# Altium schematic symbol library BARKO_SCHLIB.SchLib: 1064 symbols (part 2 of 11) (continued)
## CON-4POS-2MM (continued)
CONN HEADER VERT 4POS 2MM; Manufacturer: TE Connectivity; Manufacturer Part Number: 1735446-4; Number of Positions: 4; Connector Type: Header,Pin,Plug; Mating Retention: Yes (With); Sealable: No (Without); Contact Current Rating: 3A; Wire/Cable Type: Discrete; Connector System: Wire-to-Board; Plating Thickness: 2.03um; Pitch: 0.079inch; Wire/Cable Gauge: 30AWG; PCB Thickness: 1.6mm; Tail Length: 3.4mm; Contact Post Length: 0.134inch; .Creator: F:TALI; .PCBCHK: USED; Washability: OK; Supplier 1: Digi-Key; Stock 1: 66082; Pricing 1: 1=0.14, 10=0.131, 100=0.0808, 500=0.06688, 1000=0.05851, 5000=0.05016, 10000=0.04876 (USD); Mount: Through Hole; Color: Natural; Contact Material: Copper Alloy; Housing Color: Natural; Housing Material: Thermoplastic; Contact Plating: Bright,Tin; Contact Shape: Square; Min Operating Temperature: -13°C; Max Operating Temperature: 185°C; Number of Rows: 1; Package Quantity: 500; Packaging: Bag; Contact Gender: Male; Termination: Through Hole; Number of Contacts: 4; Orientation: Straight; Strain Relief: No (Without); Backwall/Post Interruptions: No (Without); Contact Retention: No (Without); PCB Mount Alignment: No (Without); Selectively Loaded: No (Without); Length: 10mm; Height: 0.239inch; Width: 0.185inch; Contact Mating Length: 0.132inch; Radiation Hardening: No; Flammability Rating: UL94 V-0; REACH SVHC: Unknown; ComponentLink1URL: http://www.onlinecomponents.com/productFiles/mf-AMP/pgurl_1735446-4.pdf?src-supplier=Onlinecomponents.com; ComponentLink1Description: http://www.onlinecomponents.com/productFiles/mf-AMP/pgurl_1735446-4.pdf?src-supplier=Onlinecomponents.com; ComponentLink2URL: https://www.te.com/commerce/DocumentDelivery/DDEController?Action=srchrtrv&DocNm=1735446&DocType=Customer+Drawing&DocLang=English&src-supplier=Digi-Key; ComponentLink2Description: https://www.te.com/commerce/DocumentDelivery/DDEController?Action=srchrtrv&DocNm=1735446&DocType=Customer+Drawing&DocLang=English&src-supplier=Digi-Key; Supplier Part Number 1: A100098-ND; .SCHCHK: USED
footprint CON-4POS-2MM-VERT
pins: 1 GND_IN, 2, 3, 4

## CON-4POS-2MM-PH-SM4-TB(LF)(SN)
designator J?, comment 2MM
CONN HEADER SMD R/A 4POS 2MM; Manufacturer 1: JST; Manufacturer Part Number 1: S4B-PH-SM4-TB(LF)(SN); Current Rating: 2A; Voltage Rating: 100V; Number of Positions: 4; Insulation Resistance: 1GR; Gender: Male; Contact Resistance: 20mR; Washability: OK; .Creator: M.OZKAN; .PCBCHK: USED; Supplier 1: Arrow; Stock 1: 109400; Pricing 1: 1000=0,26000, 2000=0,25260, 3000=0,24080, 5000=0,23360, 10000=0,22180, 25000=0,19960 (USD); RoHS: Yes; Mount: Surface Mount; Color: Natural; Contact Material: Copper Alloy; Contact Plating: Tin; Housing Color: Beige; Housing Material: Polyamide; Contact Shape: Square; Insulation Material: Nylon; Insulation Color: Natural; Min Operating Temperature: -25°C; Max Operating Temperature: 85°C; Number of Rows: 1; Packaging: Tape and Reel; Voltage Rating (AC): 100V; Termination: Solder; Number of Contacts: 4; Orientation: Right Angle; Number of Poles: 4; Max Current Rating: 2A; Fastening Type: Detent; Working Voltage: 100V; Max Voltage Rating (AC): 100V; Max Voltage Rating (DC): 100V; Connector Type: Header; Length: 11.9mm; Height: 9.4mm; Width: 5mm; Pitch: 2mm; Lead Pitch: 2mm; Contact Mating Length: 0.13inch; Depth: 7.6mm; Lead Free: Lead Free; REACH SVHC: No SVHC; Flammability Rating: UL94 V-0; ComponentLink1URL: https://datasheet.ciiva.com/11746/0900766b80df0d9d-11746552.pdf?src-supplier=RSComponents; ComponentLink1Description: https://datasheet.ciiva.com/11746/0900766b80df0d9d-11746552.pdf?src-supplier=RSComponents; ComponentLink2URL: https://datasheet.ciiva.com/712/eph-712578.pdf?src-supplier=Digi-Key; ComponentLink2Description: https://datasheet.ciiva.com/712/eph-712578.pdf?src-supplier=Digi-Key; ComponentLink3URL: https://datasheet.ciiva.com/712/eph-712579.pdf?src-supplier=Digi-Key; ComponentLink3Description: https://datasheet.ciiva.com/712/eph-712579.pdf?src-supplier=Digi-Key; ComponentLink4URL: https://datasheet.ciiva.com/730/eph-730675.pdf?src-supplier=Digi-Key; ComponentLink4Description: https://datasheet.ciiva.com/730/eph-730675.pdf?src-supplier=Digi-Key; ComponentLink5URL: https://datasheet.ciiva.com/8052/1699381-8052234.pdf?src-supplier=Element14; ComponentLink5Description: https://datasheet.ciiva.com/8052/1699381-8052234.pdf?src-supplier=Element14; ComponentLink6URL: https://datasheet.ciiva.com/26894/getdatasheetpartid-639990-26894620.pdf?src-supplier=Verical; ComponentLink6Description: https://datasheet.ciiva.com/26894/getdatasheetpartid-639990-26894620.pdf?src-supplier=Verical; ComponentLink7URL: https://datasheet.ciiva.com/16376/eph-16376783.pdf?src-supplier=Future+Electronics; ComponentLink7Description: https://datasheet.ciiva.com/16376/eph-16376783.pdf?src-supplier=Future+Electronics; Supplier Part Number 1: S4B-PH-SM4-TB (LF)(SN); .SCHCHK: USED
footprint CON-4POS-2MM-R/A (CONN HEADER SMD R/A 4POS 2MM)
pins: 1 GND_IN, 2, 3, 4, MP1 GND_IN, MP2 GND_IN

## CON-4POS-2MM-RA
designator J?, comment 2MM
CONN HEADER R/A 4POS 2MM; Manufacturer: JST; Manufacturer Part Number: S4B-PH-K-S(LF)(SN); Voltage Rating: 100V; Number of Poles: 4; Contact Resistance: 10mR; Current Rating: 2A; Insulation Resistance: 1GR; Gender: Male; Connector Type: Male Pin; .Creator: F:TALI; .PCBCHK: USED; Washability: OK; Supplier 1: Digi-Key; Supplier Part Number 1: 455-1721-ND; Stock 1: 350055; Pricing 1: 1=0.22, 10=0.208, 100=0.144, 500=0.12186, 1000=0.0997, 5000=0.08862, 10000=0.08031 (USD); Mount: Through Hole; Number of Pins: 4; Contact Material: Brass,Bronze,Tin; Contact Plating: Tin; Color: Natural,White; Housing Color: Natural; Min Operating Temperature: -25°C; Max Operating Temperature: 85°C; Packaging: Bulk; Termination: Solder; Number of Rows: 1; Voltage Rating (AC): 100V; Number of Positions: 4; Fastening Type: Detent; Number of Contacts: 4; Working Voltage: 100V; Orientation: Right Angle; Length: 9.9mm; Height: 9.4mm; Width: 4.5mm; Lead Pitch: 2mm; Pitch: 2mm; Contact Mating Length: 0.13inch; Lead Free: Lead Free; REACH SVHC: No SVHC; Flammability Rating: UL94 V-0; ComponentLink1URL: http://www.jst-mfg.com/product/pdf/eng/ePH.pdf?src-supplier=Digi-Key; ComponentLink1Description: http://www.jst-mfg.com/product/pdf/eng/ePH.pdf?src-supplier=Digi-Key; .SCHCHK: USED
footprint CON-4POS-2MM-RA
pins: 1 GND_IN, 2, 3, 4

## CON-4POS-2MM-SMD
designator J?, comment 2MM
CONN HEADER SMD 4POS 2MM; Manufacturer: JST; Manufacturer Part Number: B4B-PH-SM4-TB(LF)(SN); Number of Positions: 4; Connector Type: Male Pin; Contact Resistance: 20mR; Current Rating: 2A; Voltage Rating (AC): 100V; Insulation Resistance: 1GR; Gender: Male; .Creator: F:TALI; .PCBCHK: USED; Washability: OK; Supplier 1: Digi-Key; Supplier Part Number 1: 455-1736-6-ND; Stock 1: 141980; Pricing 1: 1=0.8, 10=0.75, 100=0.5751, 500=0.50006 (USD); Mount: Surface Mount; Contact Plating: Copper,Tin; Color: Natural,White; Contact Material: Brass,Bronze,Copper Alloy,Tin; Housing Color: Beige; Housing Material: Polyamide; Min Operating Temperature: -25°C; Max Operating Temperature: 85°C; Number of Rows: 1; Packaging: Tape and Reel; Voltage Rating: 100V; Max Current Rating: 2A; Number of Poles: 4; Termination: Solder; Fastening Type: Detent; Number of Contacts: 4; Max Voltage Rating (AC): 100V; Working Voltage: 100V; Orientation: Straight; Length: 11.95mm; Height: 9.4mm; Pitch: 2mm; Lead Pitch: 2mm; Width: 5.5mm; Contact Mating Length: 0.13inch; Depth: 5mm; Lead Free: Lead Free; REACH SVHC: No SVHC; Flammability Rating: UL94 V-0; ComponentLink1URL: http://www.farnell.com/datasheets/1699381.pdf?src-supplier=Element14; ComponentLink1Description: http://www.farnell.com/datasheets/1699381.pdf?src-supplier=Element14; ComponentLink2URL: http://uk.rs-online.com/webdocs/13ce/0900766b813ce4ba.pdf?src-supplier=RSComponents; ComponentLink2Description: http://uk.rs-online.com/webdocs/13ce/0900766b813ce4ba.pdf?src-supplier=RSComponents; ComponentLink3URL: http://www.farnell.com/datasheets/1699381.pdf?src-supplier=Newark; ComponentLink3Description: http://www.farnell.com/datasheets/1699381.pdf?src-supplier=Newark; ComponentLink4URL: http://www.jst-mfg.com/product/pdf/eng/ePH.pdf?src-supplier=Digi-Key; ComponentLink4Description: http://www.jst-mfg.com/product/pdf/eng/ePH.pdf?src-supplier=Digi-Key; .SCHCHK: USED
pins: 1 GND_IN, 2, 3, 4, MP1, MP2

## CON-4POS-2MM-SOW3
designator J?, comment Supplier Part Number 1: 455-1706-ND  (hidden comment: B4B-PH-K-S(LF)(SN))
CONN HEADER VERT 4POS 2MM; Manufacturer: JST; Voltage Rating: 100V; Current Rating: 2A; Contact Resistance: 20mR; Number of Poles: 4; Insulation Resistance: 1MR; Gender: Male; Connector Type: Male Pin; Washability: OK; .Creator: M.OZKAN; .PCBCHK: USED; Supplier 1: Digi-Key; Manufacturer Part Number: B4B-PH-K-S(LF)(SN); Stock 1: 16457; Pricing 1: 1=0.240000, 10=0.227000, 100=0.157300, 500=0.133120, 1000=0.108920, 5000=0.096820, 10000=0.087740 (USD); RoHS: Yes; Mount: Through Hole; Number of Pins: 4; Contact Material: Brass,Tin; Contact Plating: Tin,Copper; Color: Natural; Housing Color: White; Housing Material: Polyamide; Material: Polyamide; Min Operating Temperature: -25°C; Max Operating Temperature: 85°C; Packaging: Bulk; Termination: Solder; Number of Rows: 1; Max Current Rating: 2A; Voltage Rating (AC): 100V; Number of Positions: 4; Fastening Type: Detent; Number of Contacts: 4; Max Voltage Rating (AC): 100V; Max Voltage Rating (DC): 100V; Working Voltage: 100V; Orientation: Straight; Length: 9.9mm; Height: 9.4mm; Width: 4.5mm; Depth: 4.5mm; Lead Pitch: 2mm; Pitch: 2mm; Contact Mating Length: 0.13inch; Lead Free: Lead Free; REACH SVHC: No SVHC; ComponentLink1URL: https://datasheet.ciiva.com/11747/0900766b8082f552-11747200.pdf?src-supplier=RSComponents; ComponentLink1Description: https://datasheet.ciiva.com/11747/0900766b8082f552-11747200.pdf?src-supplier=RSComponents; ComponentLink2URL: https://datasheet.ciiva.com/712/eph-712488.pdf?src-supplier=Digi-Key; ComponentLink2Description: https://datasheet.ciiva.com/712/eph-712488.pdf?src-supplier=Digi-Key; ComponentLink3URL: https://datasheet.ciiva.com/16209/eph-16209245.pdf?src-supplier=Future+Electronics; ComponentLink3Description: https://datasheet.ciiva.com/16209/eph-16209245.pdf?src-supplier=Future+Electronics; ComponentLink4URL: https://datasheet.ciiva.com/43491/741223-da-01-en-stiftleiste-gerade-4-pol-rm2-0-43491964.pdf?src-supplier=Conrad; ComponentLink4Description: https://datasheet.ciiva.com/43491/741223-da-01-en-stiftleiste-gerade-4-pol-rm2-0-43491964.pdf?src-supplier=Conrad; .SCHCHK: USED
footprint JST-B4B-PH-K-S_V (Connector, 4-Leads, Body 9.9x4.5mm, Pitch 2mm)
pins: 1, 2, 3, 4

## CON-4POS-3MM-RA
designator J?  Mount: TH  Orientation: RA  Lead Pitch: 3mm  (hidden comment: *)
CONN HEADER 4POS 3MM RT ANG TIN; Manufacturer: Molex; Manufacturer Part Number: 43045-0400; Number of Positions: 4; Current Rating: 5A; Voltage Rating (AC): 250V; Contact Resistance: 10mR; Gender: Male; Voltage Rating: 600V; Max Voltage Rating (DC): 250.25kV; Glow Wire Compliant: Compliant; Approvals: CSA,TUV,UL; .PCBCHK: USED; .Creator: F:TALI; Washability: OK; Supplier 1: Digi-Key; Stock 1: 22999; Pricing 1: 1=1.42, 10=1.289, 100=1.1052, 500=0.92102, 2232=0.76314, 6696=0.69998, 11160=0.68419 (USD); Case/Package: SMC; Contact Material: Brass,Tin; Contact Plating: Tin; Colour: Black; Housing Colour: Black; Material: Polyester; Housing Material: Thermoplastic; Min Operating Temperature: -40°C; Max Operating Temperature: 105°C; Number of Rows: 2; Number of Contacts: 4; Packaging: Tray; Termination: Solder; Number of Circuits: 4; Package Quantity: 2232; Number of Poles: 4; Contact Gender: Male; Working Voltage: 250V; Diameter: 3mm; Pitch: 3mm; Row Spacing: 3mm; Radiation Hardening: No; Flammability Rating: UL94 V-0; Halogen Free: Low Halogen; Lead Free: Lead Free; REACH SVHC: Unknown; ComponentLink1URL: http://www.mouser.com/ds/2/276/0430450400_PCB_HEADERS-168191.pdf; ComponentLink1Description: http://www.mouser.com/ds/2/276/0430450400_PCB_HEADERS-168191.pdf; ComponentLink2URL: http://www.molex.com/webdocs/datasheets/pdf/en-us/0430450400_PCB_HEADERS.pdf; ComponentLink2Description: http://www.molex.com/webdocs/datasheets/pdf/en-us/0430450400_PCB_HEADERS.pdf; ComponentLink3URL: http://www.rapidonline.com/pdf/22-3744e.pdf; ComponentLink3Description: http://www.rapidonline.com/pdf/22-3744e.pdf; ComponentLink4URL: http://www.farnell.com/datasheets/2153088.pdf; ComponentLink4Description: http://www.farnell.com/datasheets/2153088.pdf; ComponentLink5URL: http://uk.rs-online.com/webdocs/13c3/0900766b813c3a47.pdf; ComponentLink5Description: http://uk.rs-online.com/webdocs/13c3/0900766b813c3a47.pdf; ComponentLink6URL: https://www.alliedelec.com/m/d/e1d2fe0a53791775edaf6c29add04568.pdf; ComponentLink6Description: https://www.alliedelec.com/m/d/e1d2fe0a53791775edaf6c29add04568.pdf; Supplier Part Number 1: WM1814-ND; .SCHCHK: USED
pins: 1 GND_IN, 2, 3, 4

## CON-4POS-3MM-VERT
designator J?  Orientation: VRT  Row Spacing: 3mm  Mount: TH  (hidden comment: *)
CONN HEADER 4POS 3MM VERT TIN; Manufacturer: Molex; Manufacturer Part Number: 43045-0412; Number of Positions: 4; Contact Resistance: 10mR; Max Voltage Rating (DC): 250.25kV; Current Rating: 5A; Gender: Male; Connector Type: Plug,Socket; Operating Supply Voltage: 250V; Glow Wire Compliant: Compliant; Approvals: CSA,TUV,UL; .PCBCHK: USED; .Creator: F:TALI; Washability: OK; Supplier 1: Digi-Key; Stock 1: 15048; Pricing 1: 1=1.26, 10=1.11, 100=0.9579, 500=0.78372, 2232=0.6531, 6696=0.60956, 11160=0.57908 (USD); Contact Material: Brass,Tin; Contact Plating: Tin; Colour: Black; Housing Colour: Black; Material: Polyester; Housing Material: Thermoplastic; Min Operating Temperature: -40°C; Max Operating Temperature: 105°C; Number of Rows: 2; Number of Contacts: 4; Packaging: Tray; Termination: Solder; Number of Circuits: 4; Voltage Rating: 250V; Max Current Rating: 5A; Package Quantity: 2232; Diameter: 3mm; Length: 10.15mm; Height: 9.91mm; Pitch: 3mm; Depth: 8.77mm; Radiation Hardening: No; Flammability Rating: UL94 V-0; Halogen Free: Low Halogen; Lead Free: Lead Free; REACH SVHC: Unknown; ComponentLink1URL: http://uk.rs-online.com/webdocs/13c3/0900766b813c3a54.pdf; ComponentLink1Description: http://uk.rs-online.com/webdocs/13c3/0900766b813c3a54.pdf; ComponentLink2URL: http://www.molex.com/webdocs/datasheets/pdf/en-us/0430450412_PCB_HEADERS.pdf; ComponentLink2Description: http://www.molex.com/webdocs/datasheets/pdf/en-us/0430450412_PCB_HEADERS.pdf; ComponentLink3URL: http://www.rapidonline.com/pdf/22-3730e.pdf; ComponentLink3Description: http://www.rapidonline.com/pdf/22-3730e.pdf; ComponentLink4URL: http://www.jameco.com/Jameco/Products/ProdDS/883368.pdf; ComponentLink4Description: http://www.jameco.com/Jameco/Products/ProdDS/883368.pdf; ComponentLink5URL: http://www.farnell.com/datasheets/1928349.pdf; ComponentLink5Description: http://www.farnell.com/datasheets/1928349.pdf; Supplier Part Number 1: WM1790-ND; .SCHCHK: USED
pins: 1 GND_IN, 2, 3, 4

## CON-4POS-IOLINK
designator J?, comment 3.54MM
CONN PLUG FMALE 4POS GOLD SOLDER; Manufacturer: TE Connectivity; Manufacturer Part Number: T4145515041-001; Plating: Nickel; Connector Type: Receptacle,Socket; Connector System: Wire-to-Board; Mating Retention: Yes (With); Number of Positions: 4; Shielding: Unshielded; Supplier 1: Digi-Key; Supplier Part Number 1: A126539-ND; Stock: 398; Pricing: 1=7.15, 10=6.854, 25=6.258, 50=5.96, 100=5.662, 250=5.066, 500=4.768, 1000=4.172, 2500=3.9634 (USD); RoHS: No; Mount: Panel; Insulation Material: Polyamide; Shell Material: Brass; Min Operating Temperature: -40°C; Max Operating Temperature: 85°C; Number of Signal Positions: 4; Sealable: Yes (With)
footprint CON-4PIN-IOLINK
pins: 1 GND_IN, 2, 3, 4, MH1, MH2, MH3, MH4

## CON-5POS-1MM-SMD
designator J?, comment 1MM  Mating: 5013300500
CONN HEADER SMD 5POS 1MM; Manufacturer: Molex; Manufacturer Part Number: 501331-0507; Voltage Rating: 50V; Contact Resistance: 20mR; Max Voltage Rating (DC): 5.05kV; Current Rating: 1A; Number of Positions: 5; Gender: Male; Connector Type: Male Pin; Glow Wire Compliant: Non-compliant; Washability: OK; .Creator: M.OZKAN; .PCBCHK: USED; Supplier 1: Digi-Key; Supplier Part Number 1: WM7882CT-ND; Stock 1: 29165; Pricing 1: 1=0.66000, 10=0.62200, 100=0.47670, 500=0.41448 (USD); RoHS: Yes; Mount: Surface Mount; Color: Natural; Contact Plating: Tin; Contact Material: Bronze,Tin; Housing Color: Natural; Housing Material: Nylon; Min Operating Temperature: -40°C; Max Operating Temperature: 85°C; Package Quantity: 1100; Packaging: Tape and Reel; Number of Rows: 1; Voltage Rating (AC): 50V; Termination: Solder; Fastening Type: Detent; Number of Contacts: 5; Max Voltage Rating (AC): 50V; Contact Gender: Male; Orientation: Vertical; Number of Circuits: 5; Length: 7.24mm; Pitch: 1mm; Depth: 3.6mm; Radiation Hardening: No; REACH SVHC: Unknown; Lead Free: Lead Free; ComponentLink1URL: https://datasheet.ciiva.com/11748/0900766b80b0af91-11748006.pdf?src-supplier=RSComponents; ComponentLink1Description: https://datasheet.ciiva.com/11748/0900766b80b0af91-11748006.pdf?src-supplier=RSComponents; ComponentLink2URL: https://datasheet.ciiva.com/30169/101445013310507-pcb-headers-30169975.pdf?src-supplier=Onlinecomponents.com; ComponentLink2Description: https://datasheet.ciiva.com/30169/101445013310507-pcb-headers-30169975.pdf?src-supplier=Onlinecomponents.com; ComponentLink3URL: https://datasheet.ciiva.com/9469/5013310507-pcb-headers-9469065.pdf?src-supplier=Avnet; ComponentLink3Description: https://datasheet.ciiva.com/9469/5013310507-pcb-headers-9469065.pdf?src-supplier=Avnet; ComponentLink4URL: https://datasheet.ciiva.com/5156/5013310507-pcb-headers-179252-5156221.pdf?src-supplier=Mouser; ComponentLink4Description: https://datasheet.ciiva.com/5156/5013310507-pcb-headers-179252-5156221.pdf?src-supplier=Mouser; ComponentLink5URL: https://datasheet.ciiva.com/7683/1631871-7683719.pdf?src-supplier=Element14; ComponentLink5Description: https://datasheet.ciiva.com/7683/1631871-7683719.pdf?src-supplier=Element14; .SCHCHK: USED
footprint CON-5POS-1MM-SMD
pins: 1, 2, 3, 4, 5, MP1, MP2

## CON-5POS-2.54MM-RA
designator J?  Pitch: 2.54mm  Mount: TH  (hidden comment: *)
CONN HEADER 5 POS 2.54MM; Manufacturer: Wurth Electronics; Manufacturer Part Number: 61300511121; Number of Positions: 5; Gender: Male; Connector Type: Male Pin; .PCBCHK: USED; .Creator: F:TALI; Washability: OK; Supplier 1: Digi-Key; Stock 1: 16154; Pricing 1: 1=0.25, 10=0.209, 25=0.174, 50=0.145, 100=0.132, 1000=0.12 (USD); Contact Plating: Gold; Contact Material: Copper; Colour: Black; Number of Rows: 1; Packaging: Bulk; Termination: Solder; Number of Contacts: 5; REACH SVHC: Unknown; Lead Free: Lead Free; Supplier Part Number 1: 732-5318-ND; Contact Mating Length: 0.236inch; .SCHCHK: USED
footprint CON-1X5-RA
pins: 1 GND_IN, 2, 3, 4, 5

## CON-5POS-2.54MM-VERT
designator J?  Pitch: 2.54mm  Mount: TH  (hidden comment: *)
CONN HEADER 5 POS 2.54MM; Manufacturer: Wurth Electronics; Manufacturer Part Number: 61300511121; Number of Positions: 5; Gender: Male; Connector Type: Male Pin; .PCBCHK: USED; .Creator: F:TALI; Washability: OK; Supplier 1: Digi-Key; Stock 1: 16154; Pricing 1: 1=0.25, 10=0.209, 25=0.174, 50=0.145, 100=0.132, 1000=0.12 (USD); Contact Plating: Gold; Contact Material: Copper; Colour: Black; Number of Rows: 1; Packaging: Bulk; Termination: Solder; Number of Contacts: 5; REACH SVHC: Unknown; Lead Free: Lead Free; Supplier Part Number 1: 732-5318-ND; Contact Mating Length: 0.236inch; .SCHCHK: USED
footprint CON-1X5-VERT
pins: 1 GND_IN, 2, 3, 4, 5

## CON-6POS-1MM27-VERT ERNI284698
designator J?, comment 284698
CONN WIRE TO BOARD M 6 POS 1.27MM SOLDER ST SMD; Manufacturer: ERNI; Gender: Male; Contact Resistance: 25mR; Current Rating: 2.8A; Supplier 1: Mouser; Manufacturer Part Number: 284698; Stock 1: 2326; Pricing 1: 1=2,93000, 10=2,69000, 25=2,57000, 100=2,32000, 250=2,08000, 650=1,96000 (USD); RoHS: Yes; Contact Plating: Gold; Contact Material: Copper Alloy,Gold; Housing Material: Polymer; Min Operating Temperature: -55°C; Max Operating Temperature: 125°C; Termination: Solder; Packaging: Tape and Reel; Orientation: Straight; Number of Rows: 1; Length: 12.7mm; Pitch: 1.27mm; Depth: 7mm; ComponentLink1URL: https://datasheet.ciiva.com/14153/qyerni-src-minibridge-e-14153863.pdf?src-supplier=Distrelec; ComponentLink1Description: https://datasheet.ciiva.com/14153/qyerni-src-minibridge-e-14153863.pdf?src-supplier=Distrelec; Supplier Part Number 1: 305-284698
footprint CON-6POS-1MM27-SMD-284698 (ERNI 284698)
pins: 1 GND_IN, 2, 3, 4, 5, 6, MP1 MP, MP2 MP, MP3 MP, MP4 MP

## CON-6POS-2.5MM-HOUSİNG
designator J?  Gender: RCP  Pitch: 2.5mm  (hidden comment: *)
CONN HOUSING 6POS 2.5MM SHROUD; Manufacturer: Molex; Number of Contacts: 6; Current Rating: 3A; Insulation Resistance: 1GR; Voltage Rating (AC): 250V; Connector Type: Power,Receptacle,Rectangular,Socket; Shrouded: Yes (With); Test Voltage: 1kV; Glow Wire Compliant: Non-compliant; .PCBCHK: USED; .Creator: F:TALI; Washability: OK; Supplier 1: Digi-Key; Manufacturer Part Number: 50-37-5063; Stock 1: 2670; Pricing 1: 1=0.48, 10=0.45, 25=0.4052, 50=0.36, 100=0.345, 250=0.315, 500=0.3, 1000=0.2475, 2500=0.225 (USD); Mount: Cable,Free Hanging,PCB; Housing Material: Polyamide; Material: Nylon,Polyamide; Min Operating Temperature: -40°C; Max Operating Temperature: 105°C; Orientation: Straight; Number of Rows: 1; Packaging: Bulk; Package Quantity: 10; Fastening Type: Ramp; Number of Poles: 6; Contact Gender: Female; Number of Positions: 6; Termination: Crimp; Working Voltage: 250V; Length: 17.4mm; Depth: 3.9mm; Width: 8mm; Radiation Hardening: No; REACH SVHC: Unknown; Lead Free: Lead Free; Halogen Free: Low Halogen; Flammability Rating: UL94 V-0; ComponentLink1URL: https://www.molex.com/pdm_docs/sd/050375063_sd.pdf; ComponentLink1Description: https://www.molex.com/pdm_docs/sd/050375063_sd.pdf; ComponentLink2URL: http://uk.rs-online.com/webdocs/13c3/0900766b813c31df.pdf; ComponentLink2Description: http://uk.rs-online.com/webdocs/13c3/0900766b813c31df.pdf; ComponentLink3URL: http://www.mouser.com/ds/2/276/0050375063_CRIMP_HOUSINGS-160457.pdf; ComponentLink3Description: http://www.mouser.com/ds/2/276/0050375063_CRIMP_HOUSINGS-160457.pdf; ComponentLink4URL: http://www.molex.com/webdocs/datasheets/pdf/en-us/0050375063_CRIMP_HOUSINGS.pdf; ComponentLink4Description: http://www.molex.com/webdocs/datasheets/pdf/en-us/0050375063_CRIMP_HOUSINGS.pdf; ComponentLink5URL: http://www.farnell.com/datasheets/2035859.pdf; ComponentLink5Description: http://www.farnell.com/datasheets/2035859.pdf; ComponentLink6URL: http://www.onlinecomponents.com/productFiles/mf-MOL/374960050375063_crimp_housings.pdf; ComponentLink6Description: http://www.onlinecomponents.com/productFiles/mf-MOL/374960050375063_crimp_housings.pdf; Supplier Part Number 1: WM18876-ND; .SCHCHK: USED
pins: 1 GND_IN, 2, 3, 4, 5, 6

## CON-6POS-2.5MM-VERT
designator J?, comment Mount: TH  Pitch: 2.5mm  (hidden comment: 0022035065)
CONN HEADER 6POS 2.5MM VERT TIN; Manufacturer: Molex; Number of Contacts: 6; Contact Resistance: 20mR; Current Rating: 3A; Gender: Male; Voltage Rating: 250V; Connector Type: Male Pin; Insulation Resistance: 1GR; Test Voltage: 1kV; Glow Wire Compliant: Non-compliant; .PCBCHK: USED; .Creator: F:TALI; Washability: OK; Supplier 1: Digi-Key; Manufacturer Part Number: 22-03-5065; Stock 1: 17442; Pricing 1: 1=0.96, 10=0.842, 100=0.726, 500=0.594, 1000=0.528, 5000=0.462, 10000=0.4389 (USD); Contact Plating: Copper,Tin; Contact Material: Brass,Tin; Housing Material: Nylon; Material: Nylon,Polyamide; Min Operating Temperature: -40°C; Max Operating Temperature: 105°C; Number of Rows: 1; Termination: Solder; Packaging: Bulk; Number of Positions: 6; Voltage Rating (AC): 250V; Voltage Rating (DC): 250V; Number of Circuits: 6; Package Quantity: 1; Number of Poles: 6; Working Voltage: 250V; Contact Gender: Male; Lead Pitch: 2.5mm; Contact Mating Length: 0.138inch; Radiation Hardening: No; Lead Free: Lead Free; REACH SVHC: Unknown; ComponentLink1URL: https://www.molex.com/pdm_docs/sd/022035065_sd.pdf; ComponentLink1Description: https://www.molex.com/pdm_docs/sd/022035065_sd.pdf; ComponentLink2URL: http://uk.rs-online.com/webdocs/13c2/0900766b813c2d9e.pdf; ComponentLink2Description: http://uk.rs-online.com/webdocs/13c2/0900766b813c2d9e.pdf; ComponentLink3URL: http://www.farnell.com/datasheets/1865032.pdf; ComponentLink3Description: http://www.farnell.com/datasheets/1865032.pdf; ComponentLink4URL: http://www.molex.com/webdocs/datasheets/pdf/en-us/0022035065_PCB_HEADERS.pdf; ComponentLink4Description: http://www.molex.com/webdocs/datasheets/pdf/en-us/0022035065_PCB_HEADERS.pdf; ComponentLink5URL: http://www.farnell.com/datasheets/2035864.pdf; ComponentLink5Description: http://www.farnell.com/datasheets/2035864.pdf; ComponentLink6URL: http://www.mouser.com/ds/2/276/0022035065_PCB_HEADERS-158317.pdf; ComponentLink6Description: http://www.mouser.com/ds/2/276/0022035065_PCB_HEADERS-158317.pdf; Supplier Part Number 1: WM18890-ND; Orientation: VRT; .SCHCHK: USED
footprint CON-6POS-2.5MM-VERT
pins: 1 GND_IN, 2, 3, 4, 5, 6

## CON-6POS-2.54MM
designator J?, comment 2.54MM
CONN RCPT 6POS 0.1 TIN PCB; Manufacturer 1: Harwin; Manufacturer Part Number: M20-7820646; Number of Contacts: 6; Gender: Female; Connector Type: Receptacle,Socket; Max Current Rating: 3A; Contact Resistance: 20mR; .Creator: M.OZKAN; .PCBCHK: USED; Supplier 1: Digi-Key; RoHS: Yes; Category: Headers and Wire Housings; Stock: 1847; Pricing: 1=0,96000, 10=0,84200, 100=0,72600, 500=0,59400, 1000=0,52800, 5000=0,46200, 10000=0,43890 (USD); Mount: Through Hole; Case/Package: SIL; Housing Material: Nylon; Color: Black; Contact Plating: Tin; Contact Material: Bronze; Housing Color: Black; Min Operating Temperature: -40°C; Max Operating Temperature: 105°C; Termination: Solder; Number of Rows: 1; Number of Positions: 6; Packaging: Rail/Tube; Orientation: Straight; Contact Gender: Female; Package Quantity: 38; Length: 15.64mm; Pitch: 2.54mm; Depth: 2.5mm; Radiation Hardening: No; ComponentLink1URL: http://components.arrow.com/part/dataview/0323_00725884?src-supplier=Arrow+Europe; ComponentLink1Description: http://components.arrow.com/part/dataview/0323_00725884?src-supplier=Arrow+Europe; ComponentLink2URL: http://www.harwin.com/include/downloads/pdfs/2010PAGE120.PDF?src-supplier=Avnet; ComponentLink2Description: http://www.harwin.com/include/downloads/pdfs/2010PAGE120.PDF?src-supplier=Avnet; ComponentLink3URL: https://cdn.harwin.com/pdfs/M20-782.pdf?src-supplier=Digi-Key; ComponentLink3Description: https://cdn.harwin.com/pdfs/M20-782.pdf?src-supplier=Digi-Key; ComponentLink4URL: https://cdn.harwin.com/pdfs/Harwin_PC_Connectors_M20.pdf?src-supplier=Avnet+Europe; ComponentLink4Description: https://cdn.harwin.com/pdfs/Harwin_PC_Connectors_M20.pdf?src-supplier=Avnet+Europe; ComponentLink5URL: https://cdn.harwin.com/pdfs/Harwin_PC_Connectors_M20.pdf?src-supplier=RSComponents; ComponentLink5Description: https://cdn.harwin.com/pdfs/Harwin_PC_Connectors_M20.pdf?src-supplier=RSComponents; ComponentLink6URL: https://cdn.harwin.com/pdfs/Harwin_PC_Connectors_M20.pdf?src-supplier=Mouser; ComponentLink6Description: https://cdn.harwin.com/pdfs/Harwin_PC_Connectors_M20.pdf?src-supplier=Mouser; ComponentLink7URL: https://cdn.harwin.com/pdfs/Harwin_PC_Connectors_M20.pdf?src-supplier=TTI; ComponentLink7Description: https://cdn.harwin.com/pdfs/Harwin_PC_Connectors_M20.pdf?src-supplier=TTI; Supplier Part Number 1: 952-1809-ND; .SCHCHK: USED
footprint CON-1X6-VERT-2.54MM
pins: 1 GND_IN, 2, 3, 4, 5, 6

## CON-6POS-2.54MM-691402910006B
designator J?
2.54 MM TERMINAL BLOCK, HORIZONT; Manufacturer Part Number: 691402910006B; Compliance: RoHS; Modularity: No; PCB/Cable/Panel: PCB; Pin Number: 6; Pitch: 2.54mm; Rated Current [UL]: 6A; Working Voltage [UL]: 150VAC; Washability: OK; .Creator: M.OZKAN; .PCBCHK: USED; ComponentLink1Description: Manufacturer; ComponentLink1URL: http://www.we-online.de; ComponentLink2URL: https://katalog.we-online.de/em/datasheet/691402910006B.pdf; ComponentLink2Description: Datasheet; Mounting Technology: THT; Packaging: Box; Operating Temperature: -40 to +105degC; Published Date: October 2019; Type: Horizontal; Publisher: Wurth Elektronik; Application: Screwless; .SCHCHK: USED
footprint CON-6POS-691402910006B (2.54 mm - Screwless Horizontal Entry - 06p)
pins: 1, 2, 3, 4, 5, 6

## CON-6POS-2MM
designator J?, comment 2MM
CONN HEADER VERT 6POS 2MM; Manufacturer: Sullins; Manufacturer Part Number: SWR201-NRTN-S06-SA-WH; Number of Positions: 6; Connector Type: Male Pin; Pitch: 0.079inch; .Creator: F:TALI; .PCBCHK: USED; Washability: OK; Supplier 1: Digi-Key; RoHS: Yes; Stock 1: 782; Pricing 1: 1 = 0,24000, 10 = 0,23000, 100 = 0,16100, 500 = 0,13798, 1000 = 0,11498, 5000 = 0,09855, 10000 = 0,09490 (USD); Mount: Through Hole; Color: White; Contact Plating: Tin; Package Quantity: 2000; Number of Rows: 1; Packaging: Bulk; Termination: Solder; Lead Free: Lead Free; ComponentLink1URL: https://media.digikey.com/PDF/Data%20Sheets/Sullins%20PDFs/SWR201-NRTN-Sxx-SA-WH.pdf?src-supplier=Digi-Key; ComponentLink1Description: https://media.digikey.com/PDF/Data%20Sheets/Sullins%20PDFs/SWR201-NRTN-Sxx-SA-WH.pdf?src-supplier=Digi-Key; Supplier Part Number 1: S9455-ND; .SCHCHK: USED
footprint CON-4POS-2MM-VERT
pins: 1 GND_IN, 2, 3, 4, 5, 6

## CON-6POS-2MM-HEADER
designator J?, comment 6POS
CONN HEADER SMD 6POS 2MM; Manufacturer: JST; Manufacturer Part Number: B6B-PH-SM4-TB(LF)(SN); Contact Resistance: 10mR; Current Rating: 2A; Number of Poles: 6; Voltage Rating (AC): 100V; Insulation Resistance: 1GR; Gender: Male; Connector Type: Male Pin; .Creator: F:TALI; .PCBCHK: USED; Washability: OK; Supplier 1: Digi-Key; Stock 1: 20814; Pricing 1: 1=0.85, 10=0.747, 100=0.6444, 500=0.52722 (USD); Mount: Surface Mount; Contact Material: Brass,Bronze,Copper Alloy,Tin; Color: Natural,White; Contact Plating: Tin; Housing Color: Natural; Housing Material: Nylon; Min Operating Temperature: -25°C; Max Operating Temperature: 85°C; Packaging: Tape and Reel; Number of Rows: 1; Voltage Rating: 100V; Number of Positions: 6; Termination: Solder; Fastening Type: Detent; Number of Contacts: 6; Working Voltage: 100V; Orientation: Straight; Length: 13.9mm; Height: 9.4mm; Width: 5.5mm; Lead Pitch: 2mm; Pitch: 2mm; Contact Mating Length: 0.13inch; Lead Free: Lead Free; REACH SVHC: No SVHC; Flammability Rating: UL94 V-0; ComponentLink1URL: http://www.jst-mfg.com/product/pdf/eng/ePH.pdf; ComponentLink1Description: http://www.jst-mfg.com/product/pdf/eng/ePH.pdf; ComponentLink2URL: http://uk.rs-online.com/webdocs/13ec/0900766b813ecc82.pdf; ComponentLink2Description: http://uk.rs-online.com/webdocs/13ec/0900766b813ecc82.pdf; Supplier Part Number 1: 455-1738-6-ND; .SCHCHK: USED
footprint CON-6POS-2MM-SMD
pins: 1 GND_IN, 2, 3, 4, 5, 6

## CON-6POS-2MM-RA
designator J?, comment 2MM
CONN HEADER R/A 6POS 2MM; Manufacturer: JST; Manufacturer Part Number: S6B-PH-K-S(LF)(SN); Current Rating: 2A; Voltage Rating (AC): 100V; Gender: Male; Connector Type: Male Pin; Number of Positions: 6; Insulation Resistance: 1GR; Contact Resistance: 10mR; Washability: OK; .Creator: M.OZKAN; .PCBCHK: USED; Supplier 1: Digi-Key; Supplier Part Number 1: 455-1723-ND; Stock: 1085; Pricing: 1=0.3, 10=0.285, 100=0.1993, 500=0.1708, 1000=0.1424, 5000=0.122, 10000=0.1139 (USD); RoHS: Yes; Mount: Through Hole; Number of Pins: 6; Contact Material: Bronze,Brass,Tin; Housing Color: Natural; Contact Plating: Tin; Color: Natural,White; Min Operating Temperature: -25°C; Max Operating Temperature: 85°C; Voltage Rating: 100V; Packaging: Bulk; Orientation: Right Angle; Termination: Solder; Fastening Type: Detent; Number of Contacts: 6; Working Voltage: 100V; Number of Poles: 6; Number of Rows: 1; Length: 13.9mm; Height: 9.4mm; Pitch: 2mm; Width: 4.5mm; Contact Mating Length: 0.13inch; Lead Pitch: 2mm; REACH SVHC: No SVHC; Flammability Rating: UL94 V-0; Lead Free: Lead Free; ComponentLink1URL: https://datasheet.ciiva.com/20207/523648-20207255.pdf?src-supplier=Rapid+Electronics; ComponentLink1Description: https://datasheet.ciiva.com/20207/523648-20207255.pdf?src-supplier=Rapid+Electronics; ComponentLink2URL: https://datasheet.ciiva.com/712/eph-712540.pdf?src-supplier=Digi-Key; ComponentLink2Description: https://datasheet.ciiva.com/712/eph-712540.pdf?src-supplier=Digi-Key; ComponentLink3URL: https://datasheet.ciiva.com/8052/80564-8052220.pdf?src-supplier=Element14; ComponentLink3Description: https://datasheet.ciiva.com/8052/80564-8052220.pdf?src-supplier=Element14; ComponentLink4URL: https://datasheet.ciiva.com/43492/740335-da-01-en-stiftleiste-gewinkelt-6-pol-rm2-0-43492006.pdf?src-supplier=Conrad; ComponentLink4Description: https://datasheet.ciiva.com/43492/740335-da-01-en-stiftleiste-gewinkelt-6-pol-rm2-0-43492006.pdf?src-supplier=Conrad; .SCHCHK: USED
footprint CON-6POS-2MM-RA
pins: 1 GND_IN, 2, 3, 4, 5, 6

## CON-6POS-3.81MM-SCREWLESS
designator J?  Pitch: 3.81mm  Mounting Technology: TH
TERM BLOCK 6POS 45DEG 3.81MM; Part Number: 691412320006; Compliance: Lead free / RoHS; Modularity: No; PCB/Cable/Panel: PCB; Pin Number: 6; Rated Current [UL]: 4A; Working Voltage [UL]: 300VAC; Washability: OK; .Creator: M.OZKAN; .PCBCHK: USED; ComponentLink1Description: Manufacturer; ComponentLink1URL: http://www.we-online.de; ComponentLink2URL: https://katalog.we-online.de/em/datasheet/691412320006.pdf; ComponentLink2Description: Datasheet; Packaging: Box; Operating Temperature: -30 to +120degC; Published Date: October 2019; Type: 45deg; Publisher: Wurth Elektronik; Application: Screwless; .SCHCHK: USED
footprint CON-6POS-3.81MM-SCREWLESS (3.81mm 45¡ã Cable Entry Screwless, 6p)
pins: 1, 2, 3, 4, 5, 6

## CON-6POS-RA
designator J?, comment 1.27MM
CONN HEADER R/A 6POS 1.27MM; Manufacturer 1: Harwin; Manufacturer Part Number 1: M50-3930642; Washability: OK; .Creator: M.OZKAN; .PCBCHK: USED; Supplier 1: Digi-Key; Stock 1: 1300; Pricing 1: 1=0,40000, 10=0,37800, 100=0,26460, 500=0,22680, 1000=0,18900, 5000=0,16200, 10000=0,15120 (USD); RoHS: No; Supplier Part Number 1: 952-3618-ND; .SCHCHK: USED
footprint CON-6POS-2.5MM-RA
pins: 1 GND_IN, 2, 3, 4, 5, 6

## CON-7POS-RA
designator J?, comment 2.54MM
CONN HEADER R/A 7POS 2.54MM; Manufacturer 1: Molex; Contact Resistance: 10mR; Max Current Rating: 4A; Voltage Rating: 250V; Number of Positions: 7; Gender: Male; Insulation Resistance: 50GR; Connector Type: Male Pin; Glow Wire Compliant: Non-compliant; Washability: OK; .Creator: M.OZKAN; .PCBCHK: USED; Supplier 1: Digi-Key; Manufacturer Part Number 1: 22-05-2071; Stock 1: 13219; Pricing 1: 1=0,93000, 10=0,81600, 100=0,70400, 500=0,57600, 1000=0,51200, 5000=0,44800, 10000=0,42560 (USD); RoHS: Yes; Mount: Through Hole; Color: White; Contact Plating: Tin,Copper; Contact Material: Brass; Housing Color: White; Housing Material: Nylon; Min Operating Temperature: 0°C; Max Operating Temperature: 75°C; Package Quantity: 10; Number of Rows: 1; Packaging: Bulk; Current Rating: 4A; Termination: Solder; Number of Contacts: 7; Max Voltage Rating (AC): 250V; Orientation: Right Angle; Voltage Rating (DC): 250V; Number of Circuits: 7; Length: 22.61mm; Height: 6.3mm; Pitch: 2.54mm; Contact Mating Length: 0.369inch; Radiation Hardening: No; Halogen Free: Low Halogen; Flammability Rating: UL94 V-0; ComponentLink1URL: https://datasheet.ciiva.com/711/022052021-sd-711889.pdf?src-supplier=Digi-Key; ComponentLink1Description: https://datasheet.ciiva.com/711/022052021-sd-711889.pdf?src-supplier=Digi-Key; ComponentLink2URL: https://datasheet.ciiva.com/16727/0022052071-pcb-headers-16727089.pdf?src-supplier=Avnet+Europe; ComponentLink2Description: https://datasheet.ciiva.com/16727/0022052071-pcb-headers-16727089.pdf?src-supplier=Avnet+Europe; ComponentLink3URL: https://datasheet.ciiva.com/19462/878737-19462148.pdf?src-supplier=Jameco; ComponentLink3Description: https://datasheet.ciiva.com/19462/878737-19462148.pdf?src-supplier=Jameco; ComponentLink4URL: https://datasheet.ciiva.com/36533/65930022052071-pcb-headers-36533223.pdf?src-supplier=Onlinecomponents.com; ComponentLink4Description: https://datasheet.ciiva.com/36533/65930022052071-pcb-headers-36533223.pdf?src-supplier=Onlinecomponents.com; ComponentLink5URL: https://datasheet.ciiva.com/11747/0900766b80027334-11747096.pdf?src-supplier=RSComponents; ComponentLink5Description: https://datasheet.ciiva.com/11747/0900766b80027334-11747096.pdf?src-supplier=RSComponents; ComponentLink6URL: https://datasheet.ciiva.com/5154/0022052071-pcb-headers-227046-5154745.pdf?src-supplier=Mouser; ComponentLink6Description: https://datasheet.ciiva.com/5154/0022052071-pcb-headers-227046-5154745.pdf?src-supplier=Mouser; ComponentLink7URL: https://datasheet.ciiva.com/15217/getdatasheetpartid-176583-15217562.pdf?src-supplier=Verical; ComponentLink7Description: https://datasheet.ciiva.com/15217/getdatasheetpartid-176583-15217562.pdf?src-supplier=Verical; ComponentLink8URL: https://datasheet.ciiva.com/10087/0022052071-pcb-headers-10087179.pdf?src-supplier=Avnet; ComponentLink8Description: https://datasheet.ciiva.com/10087/0022052071-pcb-headers-10087179.pdf?src-supplier=Avnet; Supplier Part Number 1: WM4105-ND; .SCHCHK: USED
footprint CON-7POS-2.54MM-RA
pins: 1 GND_IN, 2, 3, 4, 5, 6, 7

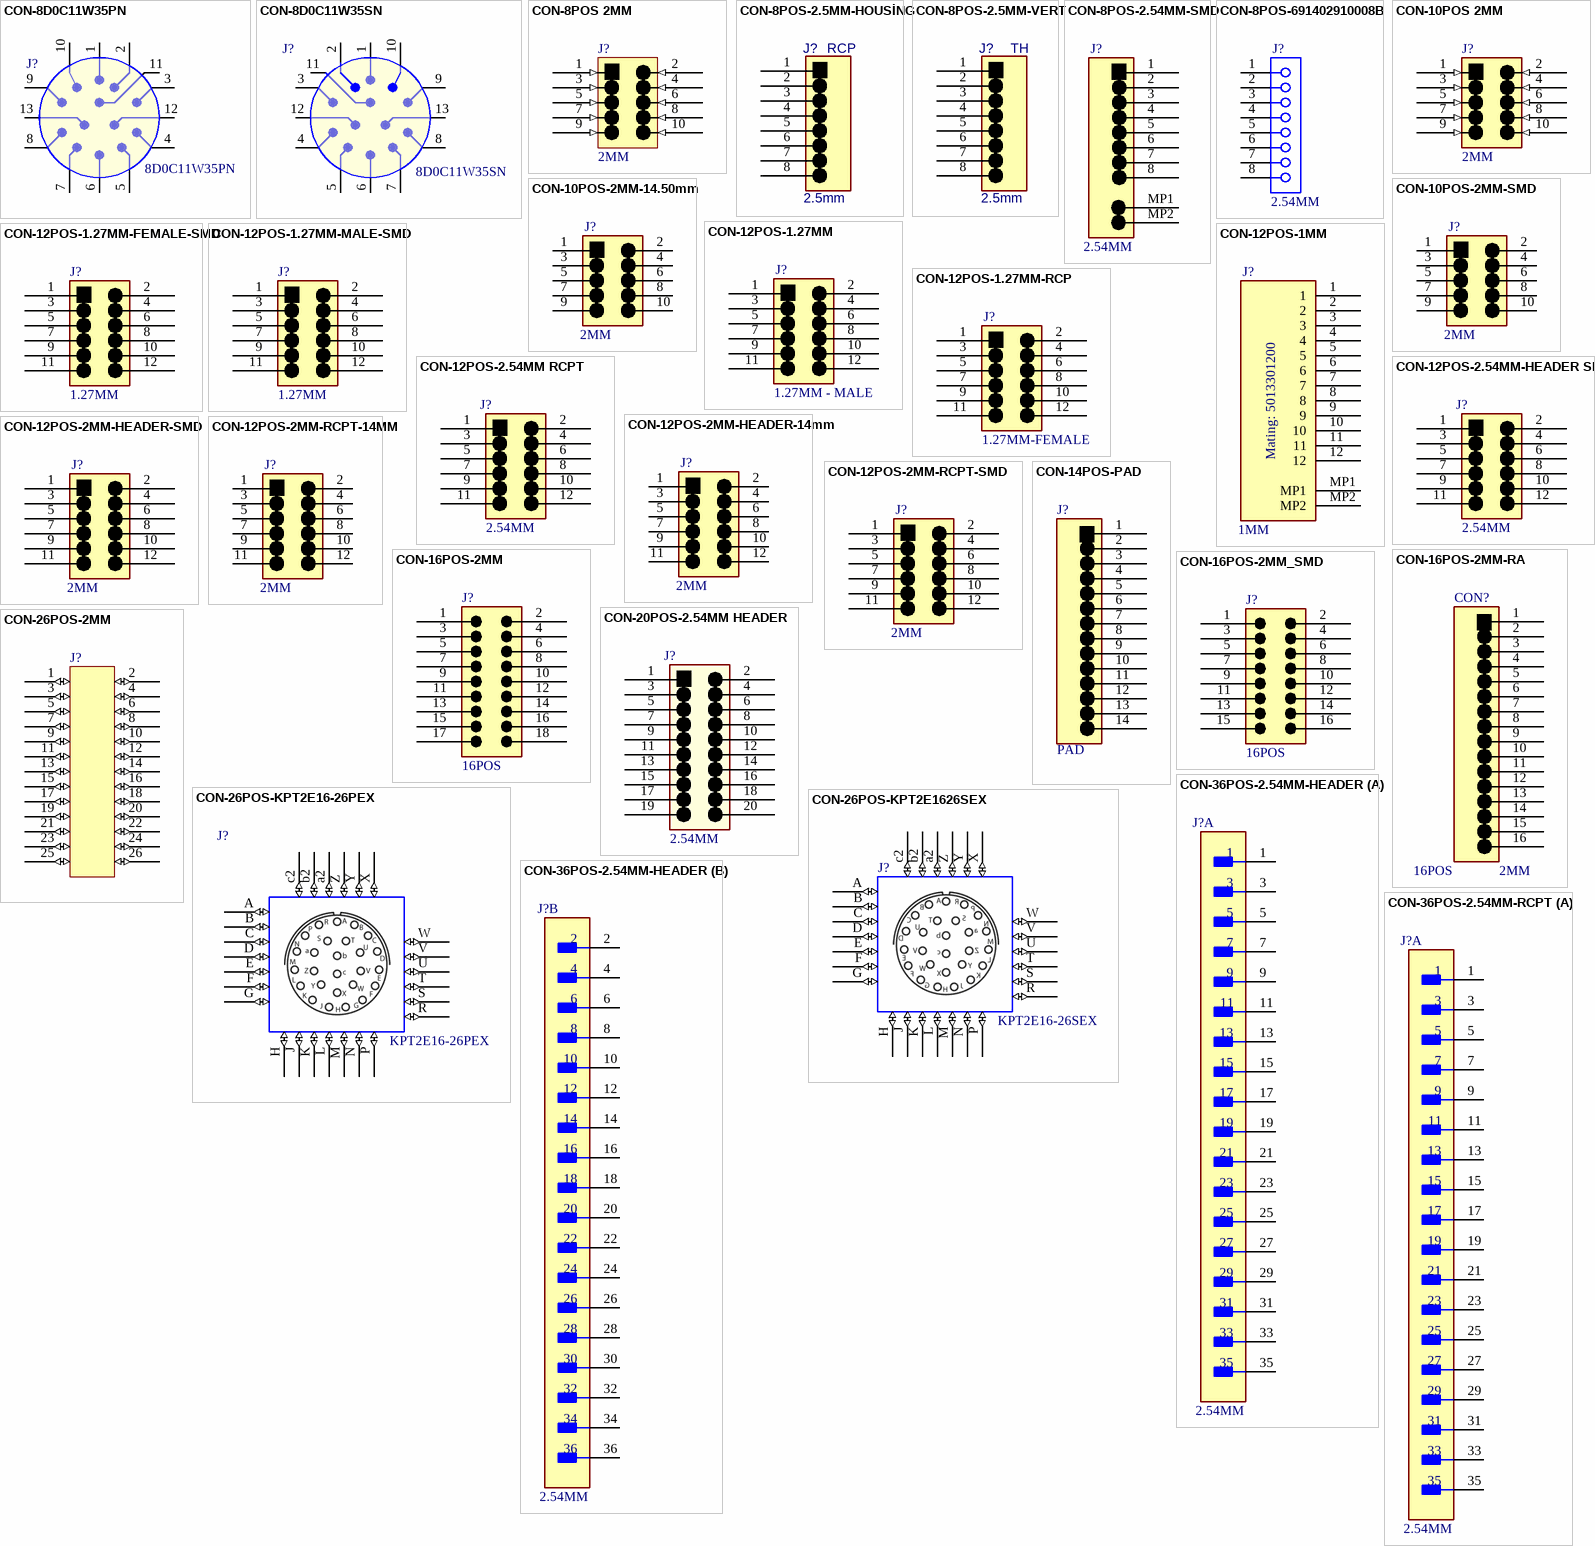
[diagram p6: symbols CON-8D0C11W35PN to CON-36POS-2.54MM-RCPT]

## CON-8D0C11W35PN
designator J?, comment 8D0C11W35PN
Souriau 8D Series, 13 Way Connector Receptacle, Pin Contacts,Shell Size 11, Screw Coupling, MIL-DTL-38999; Plating: Cadmium; Current Rating: 5A; Gender: Female; Number of Contacts: 13; Ratings: IP67; Washability: OK; .Creator: M.OZKAN; .PCBCHK: USED; Supplier 1: Digi-Key; Manufacturer: Souriau; Manufacturer Part Number: 8D0C11W35PN; Stock 1: 0; Pricing 1: 1=64.47000, 10=60.67400, 25=58.77760, 50=54.98540, 100=51.95180 (USD); RoHS: No; Mount: Screw; Contact Material: Copper Alloy; Contact Plating: Gold; Housing Material: Aluminium; Min Operating Temperature: -65°C; Max Operating Temperature: 175°C; Contact Gender: Male; Military Standard: MIL-DTL-38999; Termination: Crimp; Orientation: Straight; ComponentLink1URL: https://datasheet.ciiva.com/11736/0900766b80f13572-11736319.pdf?src-supplier=RSComponents; ComponentLink1Description: https://datasheet.ciiva.com/11736/0900766b80f13572-11736319.pdf?src-supplier=RSComponents; Supplier Part Number 1: 8D0C11W35PN-ND; .SCHCHK: USED
footprint CON-8D0C11W35PN (8D 13C 13#22D PIN RECP)
pins: 1, 2, 3, 4, 5, 6 P6, 7, 8, 9, 10, 11, 12, 13

## CON-8D0C11W35SN
designator J?, comment 8D0C11W35SN
8D 13C 13#22D SKT RECP; Manufacturer: Souriau; Washability: OK; .Creator: M.OZKAN; .PCBCHK: USED; Supplier 1: Digi-Key; Manufacturer Part Number: 8D0C11W35SN; Stock 1: 109; Pricing 1: 1=87.71000, 10=82.55200, 25=79.97240, 50=74.81280, 100=70.68520 (USD); RoHS: No; Supplier Part Number 1: 1792-4148-ND; .SCHCHK: USED
footprint CON-8D0C11W35SN (8D 13C 13#22D PIN RECP)
pins: 1, 2, 3, 4, 5, 6 P6, 7, 8, 9, 10, 11, 12, 13

## CON-8POS 2MM
designator J?, comment 2MM
CONN HEADER SMD 8POS 1.27MM; Manufacturer: Amphenol FCI; Manufacturer Part Number: 20021121-00008C1LF; Number of Positions: 8; Connector Type: Male Pin; Pitch: 0.05inch; Washability: OK; .Creator: M.OZKAN; .PCBCHK: USED; Supplier 1: Digi-Key; Stock 1: 503; Pricing 1: 1=1.11000, 10=0.69500, 25=0.59480, 50=0.53460, 100=0.52350, 250=0.44552 (USD); RoHS: Yes; Mount: Surface Mount; Contact Plating: Gold; Color: Black; Number of Rows: 2; Packaging: Tape and Reel; Package Quantity: 600; Termination: Solder; Number of Contacts: 8; Row Spacing: 0.05inch; Contact Mating Length: 0.12inch; ComponentLink1URL: http://portal.fciconnect.com/Comergent/fci/drawing/20021121.pdf?src-supplier=Avnet; ComponentLink1Description: http://portal.fciconnect.com/Comergent/fci/drawing/20021121.pdf?src-supplier=Avnet; ComponentLink2URL: http://portal.fciconnect.com/Comergent//fci/drawing/20021121.pdf?src-supplier=Digi-Key; ComponentLink2Description: http://portal.fciconnect.com/Comergent//fci/drawing/20021121.pdf?src-supplier=Digi-Key; Supplier Part Number 1: 609-5780-1-ND; .SCHCHK: USED
footprint CON-8POS 2MM SMD (Footprint not found)
pins: 1 (in), 2 (in), 3 (in), 4 (in), 5 (in), 6 (in), 7 (in), 8 (in), 9 (in), 10 (in)

## CON-8POS-2.5MM-HOUSİNG
designator J?  Pitch: 2.5mm  Gender: RCP  (hidden comment: *)
CONN HOUSING 8POS 2.5MM SHROUD; Manufacturer: Molex; Number of Contacts: 6; Current Rating: 3A; Insulation Resistance: 1GR; Voltage Rating (AC): 250V; Connector Type: Power,Receptacle,Rectangular,Socket; Shrouded: Yes (With); Test Voltage: 1kV; Glow Wire Compliant: Non-compliant; .PCBCHK: USED; .Creator: F:TALI; Washability: OK; Supplier 1: Digi-Key; Manufacturer Part Number: 50-37-5063; Stock 1: 2670; Pricing 1: 1=0.48, 10=0.45, 25=0.4052, 50=0.36, 100=0.345, 250=0.315, 500=0.3, 1000=0.2475, 2500=0.225 (USD); Mount: Cable,Free Hanging,PCB; Housing Material: Polyamide; Material: Nylon,Polyamide; Min Operating Temperature: -40°C; Max Operating Temperature: 105°C; Orientation: Straight; Number of Rows: 1; Packaging: Bulk; Package Quantity: 10; Fastening Type: Ramp; Number of Poles: 6; Contact Gender: Female; Number of Positions: 6; Termination: Crimp; Working Voltage: 250V; Length: 17.4mm; Depth: 3.9mm; Width: 8mm; Radiation Hardening: No; REACH SVHC: Unknown; Lead Free: Lead Free; Halogen Free: Low Halogen; Flammability Rating: UL94 V-0; ComponentLink1URL: https://www.molex.com/pdm_docs/sd/050375063_sd.pdf; ComponentLink1Description: https://www.molex.com/pdm_docs/sd/050375063_sd.pdf; ComponentLink2URL: http://uk.rs-online.com/webdocs/13c3/0900766b813c31df.pdf; ComponentLink2Description: http://uk.rs-online.com/webdocs/13c3/0900766b813c31df.pdf; ComponentLink3URL: http://www.mouser.com/ds/2/276/0050375063_CRIMP_HOUSINGS-160457.pdf; ComponentLink3Description: http://www.mouser.com/ds/2/276/0050375063_CRIMP_HOUSINGS-160457.pdf; ComponentLink4URL: http://www.molex.com/webdocs/datasheets/pdf/en-us/0050375063_CRIMP_HOUSINGS.pdf; ComponentLink4Description: http://www.molex.com/webdocs/datasheets/pdf/en-us/0050375063_CRIMP_HOUSINGS.pdf; ComponentLink5URL: http://www.farnell.com/datasheets/2035859.pdf; ComponentLink5Description: http://www.farnell.com/datasheets/2035859.pdf; ComponentLink6URL: http://www.onlinecomponents.com/productFiles/mf-MOL/374960050375063_crimp_housings.pdf; ComponentLink6Description: http://www.onlinecomponents.com/productFiles/mf-MOL/374960050375063_crimp_housings.pdf; Supplier Part Number 1: WM18876-ND; .SCHCHK: USED
pins: 1 GND_IN, 2, 3, 4, 5, 6, 7, 8

## CON-8POS-2.5MM-VERT
designator J?  Mount: TH  Pitch: 2.5mm  (hidden comment: *)